# Altium footprint library Minh_Lib.PcbLib: 141 footprints (part 2 of 9)
Each footprint in its own frame and in the unit in brackets; x right, y up, seen from the top. Pads: shape width x height; smd on the part's side, far side on the other; paste and mask are expansions set on the pad; w line width, h text height; cw(c..) or ccw(c..) is an arc to the next point about the centre after c.
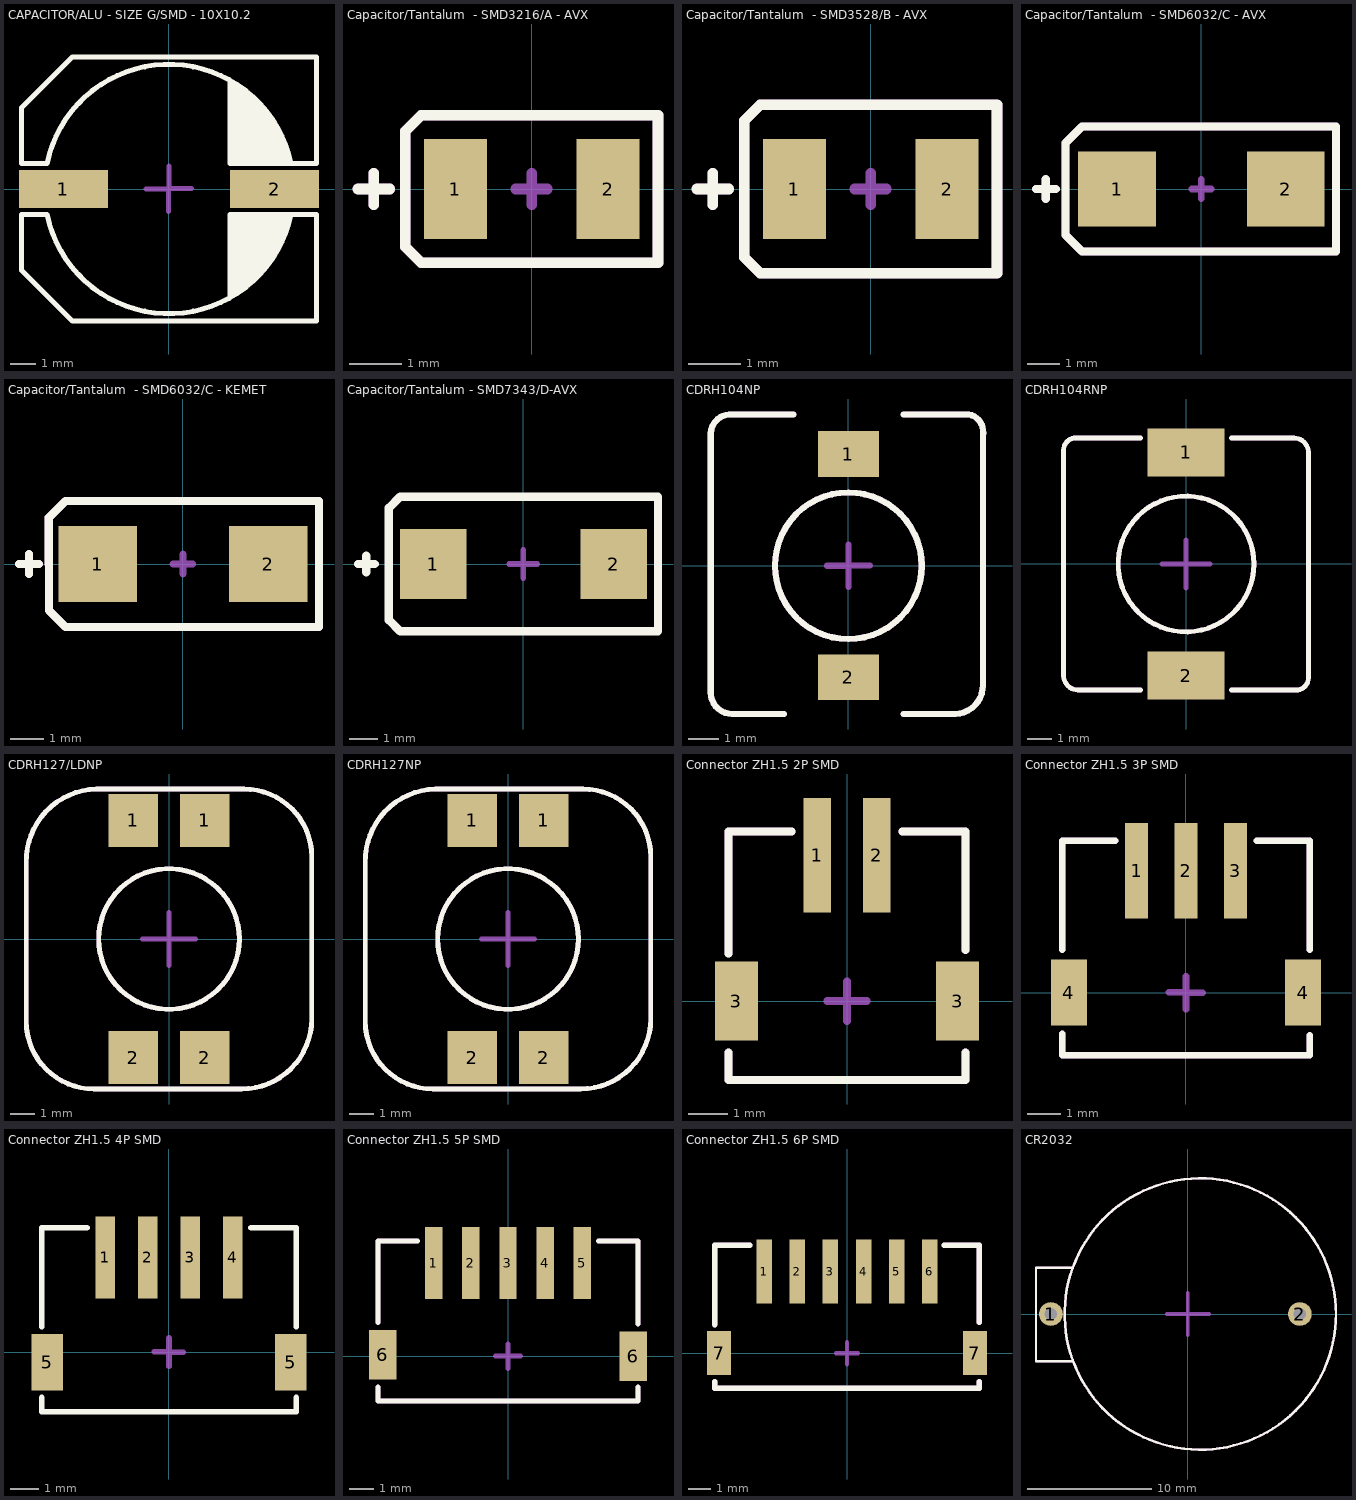
[diagram p1: the footprints below, top view; thin cyan lines are the x and y axes]

## CAPACITOR/ALU - SIZE G/SMD - 10X10.2 [mm] "CAPACITOR  -  ALUMINIUM - SIZE G / EEEFK - SMD"
pads (2):
  rect 3.5x1.5 smd: 1(-4.15,0) 2(4.15,0)
Top Overlay:
  region: 2.4,4.2 2.4,1 4.8,1 4.7,1.1 4.7,1.5 4.5,1.7 4.5,2.1 4.2,2.5 4.1,2.8 3.4,3.5 3.4,3.6
  region: 2.4,-4.2 2.4,-1 4.8,-1 4.8,-1.2 4.6,-1.4 4.6,-1.8 4.4,-2 4.4,-2.3 3.9,-2.8 3.9,-3 3,-3.9 2.9,-3.9
  lines w0.2: 2.4,-4.2 2.4,-1 4.8,-1 ; 2.4,4.2 2.4,1 4.8,1 ; 4.8,-1 cw(c0,0) -4.8,-1 -5.8,-1 -5.8,-3.2 -3.8,-5.2 5.8,-5.2 5.8,-1 4.8,-1 ; 4.8,1 ccw(c0,0) -4.8,1 -5.8,1 -5.8,3.2 -3.8,5.2 5.8,5.2 5.8,1 4.8,1
Mechanical 13:
  text "'.Designator'" at -5.701,-0.502 h1.5
Mechanical 15:
  lines w0.2: -0.909,0.007 -0.009,0.007 ; -0.013,-0.889 -0.013,0.011 ; -0.013,0.015 0.887,0.015 ; 0,0 0,0.9
3D body "User Library-capacitor size G.step": height 10.21, standoff -0.01, extent -5.8,-5.15 5.8,5.15

## Capacitor/Tantalum  - SMD3216/A - AVX [mm] "1206/3216-18 SIZE A-AVX"
pads (2):
  rect 1.2x1.9 smd: 1(-1.45,0) 2(1.45,0)
Top Overlay:
  lines w0.2: -3.3,0 -3,0 ; -3,-0.3 -3,0 ; -3,0.3 -3,0 ; -2.7,0 -3,0 ; -2.4,-1.1 -2.4,0.9 -2.4,1.1 -2.1,1.4 2.4,1.4 2.4,-1.4 -1.04,-1.4 -2.1,-1.4 -2.4,-1.1
Mechanical 13:
  lines w0.2: -3.3,0 -3,0 ; -3,-0.3 -3,0 ; -3,0.3 -3,0 ; -2.7,0 -3,0 ; -2.4,-1.1 -2.4,0.9 -2.4,1.1 -2.1,1.4 2.4,1.4 2.4,-1.4 -1.04,-1.4 -2.1,-1.4 -2.4,-1.1
  text "'.Designator'" at -1.96,-0.927 h1
Mechanical 15:
  lines w0.2: -0.3,0 0,0 ; 0,-0.3 0,0 ; 0,0.3 0,0 ; 0.3,0 0,0
3D body "User Library-AVX_ACASE.STEP": height 1.71, standoff 0, extent -1.7,-0.84 1.7,0.84

## Capacitor/Tantalum  - SMD3528/B - AVX [mm] "1210/3528-15 SIZE B-AVX"
pads (2):
  rect 1.2x1.9 smd: 1(-1.45,0) 2(1.45,0)
Top Overlay:
  lines w0.2: -3.3,0 -3,0 ; -3,-0.3 -3,0 ; -3,0.3 -3,0 ; -2.7,0 -3,0 ; -2.4,-1.3 -2.4,-1.1 -2.4,0.9 -2.4,1.1 -2.4,1.3 -2.1,1.6 2.4,1.6 2.4,-1.6 -0.84,-1.6 -2.1,-1.6 -2.4,-1.3
Mechanical 13:
  lines w0.2: -3.3,0 -3,0 ; -3,-0.3 -3,0 ; -3,0.3 -3,0 ; -2.7,0 -3,0 ; -2.4,-1.3 -2.4,-1.1 -2.4,0.9 -2.4,1.1 -2.4,1.3 -2.1,1.6 2.4,1.6 2.4,-1.6 -0.84,-1.6 -2.1,-1.6 -2.4,-1.3
  text "'.Designator'" at -2.01,-0.927 h1
Mechanical 15:
  lines w0.2: -0.3,0 0,0 ; 0,-0.3 0,0 ; 0,0.3 0,0 ; 0.3,0 0,0
3D body "User Library-AVX_BCASE.step": height 2.03, standoff 0, extent -1.85,-1.465 1.85,1.465

## Capacitor/Tantalum  - SMD6032/C - AVX [mm] "C-6032 / AVX"
pads (2):
  rect 2.37x2.3 smd: 1(-2.57,0) 2(2.57,0)
Top Overlay:
  lines w0.25: -5.04,0 -4.74,0 ; -4.74,-0.3 -4.74,0 ; -4.74,0.3 -4.74,0 ; -4.44,0 -4.74,0 ; -4.14,0 -4.14,1.3 -4.14,1.4 -3.64,1.9 -3.34,1.9 4.1,1.9 4.1,-1.9 -3.34,-1.9 -3.64,-1.9 -4.139,-1.401 -4.139,-1.284 -4.139,0.016
Mechanical 13:
  lines w0.25: -5.04,0 -4.74,0 ; -4.74,-0.3 -4.74,0 ; -4.74,0.3 -4.74,0 ; -4.44,0 -4.74,0 ; -4.14,0 -4.14,1.3 -4.14,1.4 -3.64,1.9 -3.34,1.9 4.1,1.9 4.1,-1.9 -3.34,-1.9 -3.64,-1.9 -4.139,-1.401 -4.139,-1.284 -4.139,0.016
  text "'.Designator'" at -3.501,-1.428 h1
Mechanical 15:
  lines w0.2: -0.3,0 0,0 ; 0,-0.3 0,0 ; 0,0.3 0,0 ; 0.3,0 0,0
3D body "User Library-AVX_C_CASE.step": height 2.7, standoff 0, extent -3.05,-1.675 3.05,1.675

## Capacitor/Tantalum  - SMD6032/C - KEMET [mm] "C-6032 / KEMET"
pads (2):
  rect 2.37x2.3 smd: 1(-2.57,0) 2(2.57,0)
Top Overlay:
  lines w0.25: -4.94,0 -4.64,0 ; -4.64,-0.3 -4.64,0 ; -4.64,0.3 -4.64,0 ; -4.34,0 -4.64,0 ; -4.04,0 -4.04,1.3 -4.04,1.4 -3.54,1.9 -3.24,1.9 4.1,1.9 4.1,-1.9 -3.24,-1.9 -3.54,-1.9 -4.039,-1.401 -4.039,0.016
Mechanical 13:
  lines w0.25: -4.94,0 -4.64,0 ; -4.64,-0.3 -4.64,0 ; -4.64,0.3 -4.64,0 ; -4.34,0 -4.64,0 ; -4.04,0 -4.04,1.3 -4.04,1.4 -3.54,1.9 -3.24,1.9 4.1,1.9 4.1,-1.9 -3.24,-1.9 -3.54,-1.9 -4.039,-1.401 -4.039,-1.284 -4.039,0.016
  text "'.Designator'" at -3.401,-1.428 h1
Mechanical 15:
  lines w0.2: -0.3,0 0,0 ; 0,-0.3 0,0 ; 0,0.3 0,0 ; 0.3,0 0,0
3D body "t494c107k006at.stp": height 2.81, standoff 0.01, extent -3.15,-1.75 3.15,1.75

## Capacitor/Tantalum - SMD7343/D-AVX [mm] "D-7343/AVX"
pads (2):
  rect 2.37x2.5 smd: 1(-3.22,0) 2(3.22,0)
Top Overlay:
  lines w0.3: -5.9,0 -5.6,0 ; -5.6,-0.3 -5.6,0 ; -5.6,0.3 -5.6,0 ; -5.3,0 -5.6,0 ; -4.8,-2 -4.8,-1.6 -4.8,1.5 -4.8,2 -4.4,2.4 4.8,2.4 4.8,-2.4 -4.4,-2.4 -4.8,-2
Mechanical 13:
  text "'.Designator'" at -4.36,-1.827 h1.3
Mechanical 15:
  lines w0.2: -0.5,0 0,0 ; 0,-0.5 0,0 ; 0,0.5 0,0 ; 0.5,0 0,0
3D body "User Library-AVX_D_CASE.step": height 3.01, standoff 0, extent -3.75,-2.225 3.65,2.225

## CDRH104NP [mm] "Inductor"
pads (2):
  rect 2x1.5 smd: 1(0,3.65) 2(0,-3.65)
Top Overlay:
  circle w0.2: c0,0 r2.4
  lines w0.2: -2.1,-4.85 -3.8,-4.85 cw(c-3.8,-4.15) -4.5,-4.15 -4.5,-2.65 -4.5,4.25 cw(c-3.85,4.3) -3.9,4.95 -1.8,4.95 ; 1.8,-4.85 3.5,-4.85 ccw(c3.475,-3.925) 4.4,-3.9 4.4,-2.15 4.4,4.25 ccw(c3.825,4.375) 3.95,4.95 1.8,4.95
Mechanical 13:
  circle w0.2: c0,0 r2.4
  lines w0.2: -2.1,-4.85 -3.8,-4.85 cw(c-3.8,-4.15) -4.5,-4.15 -4.5,-2.65 -4.5,4.25 cw(c-3.85,4.3) -3.9,4.95 -1.8,4.95 ; 1.8,-4.85 3.5,-4.85 ccw(c3.475,-3.925) 4.4,-3.9 4.4,-2.15 4.4,4.25 ccw(c3.825,4.375) 3.95,4.95 1.8,4.95
  text "'.Designator'" at -3.65,-3.667 h1
Mechanical 15:
  lines w0.2: -0.7,0 0,0 0,0.7 ; 0,-0.693 0,0.007 0.7,0.007
3D body "User Library-CDRH104.STEP": height 5, standoff 0, extent -4.45,-4.9 4.45,4.9

## CDRH104RNP [mm] "Inductor"
pads (2):
  rect 3.2x2 smd: 1(0,4.65) 2(0,-4.65)
Top Overlay:
  circle w0.2: c0,0 r2.828
  lines w0.2: -1.9,-5.25 -4.5,-5.25 cw(c-4.5,-4.65) -5.1,-4.65 -5.1,4.75 cw(c-4.6,4.75) -4.6,5.25 -1.9,5.25 ; 1.9,-5.25 4.6,-5.25 ccw(c4.6,-4.75) 5.1,-4.75 5.1,4.65 ccw(c4.5,4.65) 4.5,5.25 1.9,5.25
Mechanical 13:
  circle w0.2: c0,0 r2.828
  lines w0.2: -1.9,-5.25 -4.5,-5.25 cw(c-4.5,-4.65) -5.1,-4.65 -5.1,4.75 cw(c-4.6,4.75) -4.6,5.25 -1.9,5.25 ; 1.9,-5.25 4.6,-5.25 ccw(c4.6,-4.75) 5.1,-4.75 5.1,4.65 ccw(c4.5,4.65) 4.5,5.25 1.9,5.25
  text "'.Designator'" at -3.85,-3.517 h1
Mechanical 15:
  lines w0.2: -1,0 0,0 ; 0,-1 0,0 ; 0,1 0,0 ; 1,0 0,0
3D body "User Library-cdrh104r.STEP": height 4.05, standoff 0.05, extent -5.15,-5.25 5.15,5.25

## CDRH127/LDNP [mm] "Inductor"
pads (4):
  rect 2.05x2.2 smd: 1(-1.475,4.9) 1(1.475,4.9) 2(-1.475,-4.9) 2(1.475,-4.9)
Top Overlay:
  circle w0.2: c0,0 r2.907
  lines w0.2: -5.9,3.15 cw(c-2.925,3.225) -3,6.2 3.1,6.2 cw(c3.1,3.4) 5.9,3.4 5.9,3 5.9,0 5.9,-3 5.9,-3.3 cw(c3,-3.3) 3,-6.2 -3.1,-6.2 cw(c-3.1,-3.4) -5.9,-3.4 -5.9,-3 -5.9,0 -5.9,3 -5.9,3.3
Mechanical 13:
  circle w0.2: c0,0 r2.907
  lines w0.2: -5.9,3.15 cw(c-2.925,3.225) -3,6.2 3.1,6.2 cw(c3.1,3.4) 5.9,3.4 5.9,3 5.9,0 5.9,-3 5.9,-3.3 cw(c3,-3.3) 3,-6.2 -3.1,-6.2 cw(c-3.1,-3.4) -5.9,-3.4 -5.9,-3 -5.9,0 -5.9,3 -5.9,3.3
  text "'.Designator'" at -4.65,-4.417 h1
Mechanical 15:
  lines w0.2: -1.1,0 0,0 ; 0,-1.1 0,0 ; 0,1.1 0,0 ; 1.1,0 0,0
3D body "SUMIDA-CDRH127.step": height 7.45, standoff 0, extent -6,-6.171 6,6.171

## CDRH127NP [mm] "Inductor"
pads (4):
  rect 2.05x2.2 smd: 1(-1.475,4.9) 1(1.475,4.9) 2(-1.475,-4.9) 2(1.475,-4.9)
Top Overlay:
  circle w0.2: c0,0 r2.907
  lines w0.2: -5.9,3.15 cw(c-2.925,3.225) -3,6.2 3.1,6.2 cw(c3.1,3.4) 5.9,3.4 5.9,3 5.9,0 5.9,-3 5.9,-3.3 cw(c3,-3.3) 3,-6.2 -3.1,-6.2 cw(c-3.1,-3.4) -5.9,-3.4 -5.9,-3 -5.9,0 -5.9,3 -5.9,3.3
Mechanical 13:
  circle w0.2: c0,0 r2.907
  lines w0.2: -5.9,3.15 cw(c-2.925,3.225) -3,6.2 3.1,6.2 cw(c3.1,3.4) 5.9,3.4 5.9,3 5.9,0 5.9,-3 5.9,-3.3 cw(c3,-3.3) 3,-6.2 -3.1,-6.2 cw(c-3.1,-3.4) -5.9,-3.4 -5.9,-3 -5.9,0 -5.9,3 -5.9,3.3
  text "'.Designator'" at -4.65,-4.417 h1
Mechanical 15:
  lines w0.2: -1.1,0 0,0 ; 0,-1.1 0,0 ; 0,1.1 0,0 ; 1.1,0 0,0
3D body "SUMIDA-CDRH127.step": height 7.45, standoff 0, extent -6,-6.171 6,6.171

## Connector ZH1.5 2P SMD [mm]
pads (4):
  rect 0.7x2.9 smd: 1(-0.75,3.7) 2(0.75,3.7)
  rect 1.1x2 smd: 3(-2.8,0) 3(2.8,0)
Top Overlay:
  lines w0.2: -3,-1.3 -3,-2 3,-2 3,-1.3 ; -3,1.2 -3,4.3 -1.4,4.3 ; 1.4,4.3 3,4.3 3,1.3
Mechanical 13:
  lines w0.2: -3,-1.3 -3,-2 3,-2 3,-1.3 ; -3,1.2 -3,4.3 -1.4,4.3 ; 1.4,4.3 3,4.3 3,1.3
  text "'.Designator'" at -2.75,-1.417 h1
Mechanical 15:
  lines w0.2: -0.5,0 0,0 ; 0,-0.5 0,0 ; 0,0.5 0,0 ; 0.5,0 0,0
3D body "ZH1_5 2P.STEP": height 3.8, standoff 0, extent -3,-2 3,4.5

## Connector ZH1.5 3P SMD [mm]
pads (5):
  rect 0.7x2.9 smd: 1(-1.5,3.7) 2(0,3.7) 3(1.5,3.7)
  rect 1.1x2 smd: 4(-3.55,0) 4(3.55,0)
Top Overlay:
  lines w0.2: -3.75,-1.25 -3.75,-1.9 3.75,-1.9 3.75,-1.3 ; -3.75,1.3 -3.75,4.6 -2.15,4.6 ; 2.15,4.6 3.75,4.6 3.75,1.3
Mechanical 13:
  lines w0.2: -3.75,-1.25 -3.75,-1.9 3.75,-1.9 3.75,-1.3 ; -3.75,1.3 -3.75,4.6 -2.15,4.6 ; 2.15,4.6 3.75,4.6 3.75,1.3
  text "'.Designator'" at -3.65,-1.467 h1
Mechanical 15:
  lines w0.2: -0.518,0.015 -0.018,0.015 ; 0,-0.5 0,0 ; 0,0.5 0,0 ; 0.5,0 0,0
3D body "ZH1_5 3P.STEP": height 3.8, standoff 0, extent -3.75,-1.9 3.75,4.6

## Connector ZH1.5 4P SMD [mm]
pads (6):
  rect 0.7x2.9 smd: 1(-2.25,3.35) 2(-0.75,3.35) 3(0.75,3.35) 4(2.25,3.35)
  rect 1.1x2 smd: 5(-4.3,-0.35) 5(4.3,-0.35)
Top Overlay:
  lines w0.2: -4.5,-1.6 -4.5,-2.1 4.5,-2.1 4.5,-1.6 ; -4.5,0.9 -4.5,4.4 -2.9,4.4 ; 2.9,4.4 4.5,4.4 4.5,0.9
Mechanical 13:
  text "'.Designator'" at -4.35,-1.517 h1
Mechanical 15:
  lines w0.2: -0.518,0.015 -0.018,0.015 ; 0,-0.5 0,0 ; 0,0.5 0,0 ; 0.5,0 0,0
3D body "ZH1_5 4P.STEP": height 3.8, standoff 0, extent -4.5,-2.1 4.5,4.4

## Connector ZH1.5 5P SMD [mm]
pads (7):
  rect 0.7x2.9 smd: 1(-3,3.75) 2(-1.5,3.75) 3(0,3.75) 4(1.5,3.75) 5(3,3.75)
  rect 1.1x2 smd: 6(-5.05,0.05) 6(5.05,0)
Top Overlay:
  lines w0.2: -5.25,-1.25 -5.25,-1.8 5.25,-1.8 5.25,-1.25 ; -5.25,1.35 -5.25,4.65 -3.65,4.65 ; 3.65,4.65 5.25,4.65 5.25,1.3
Mechanical 13:
  lines w0.2: -5.25,-1.25 -5.25,-1.8 5.25,-1.8 5.25,-1.25 ; -5.25,1.35 -5.25,4.65 -3.65,4.65 ; 3.65,4.65 5.25,4.65 5.25,1.3
  text "'.Designator'" at -5.1,-1.317 h1
Mechanical 15:
  lines w0.2: -0.5,0 0,0 ; 0,-0.5 0,0 ; 0,0.5 0,0 ; 0.5,0 0,0
3D body "ZH1_5 5P.STEP": height 3.8, standoff 0, extent -5.25,-1.8 5.25,4.7

## Connector ZH1.5 6P SMD [mm]
pads (8):
  rect 0.7x2.9 smd: 1(-3.75,3.7) 2(-2.25,3.7) 3(-0.75,3.7) 4(0.75,3.7) 5(2.25,3.7) 6(3.75,3.7)
  rect 1.1x2 smd: 7(-5.8,0) 7(5.8,0)
Top Overlay:
  lines w0.254: -6,-1.3 -6,-1.6 6,-1.6 6,-1.3 ; -6,1.3 -6,4.9 -4.4,4.9 ; 4.4,4.9 6,4.9 6,1.4
Mechanical 13:
  lines w0.254: -6,-1.3 -6,-1.6 6,-1.6 6,-1.3 ; -6,1.3 -6,4.9 -4.4,4.9 ; 4.4,4.9 6,4.9 6,1.4
  text "'.Designator'" at -5.85,-1.117 h1
Mechanical 15:
  lines w0.2: -0.5,0 0,0 ; 0,-0.5 0,0 ; 0,0.5 0,0 ; 0.5,0 0,0
3D body "ZH1_5 6P.STEP": height 3.8, standoff 0, extent -6,-1.6 6,4.9

## CR2032 [mm]
pads (2):
  round 1.9 hole 1: 1(-11,0) 2(9,0)
Top Overlay:
  circle w0.2: c1,0 r10.9
  lines w0.2: -9.3,-3.8 -12.2,-3.8 -12.2,3.7 -9.3,3.7
Mechanical 13:
  circle w0.2: c1,0 r10.9
  lines w0.2: -9.3,-3.8 -12.2,-3.8 -12.2,3.7 -9.3,3.7
  text "'.Designator'" at -7.6,-5.834 h2
Mechanical 15:
  lines w0.3: -1.7,0 0,0 ; 0,-1.7 0,0 ; 0,1.7 0,0 ; 1.7,0 0,0
3D body "KLS5-CR2032-01 battery holder.stp": height 9.7, standoff -2.8, extent -12.25,-11.05 12.05,11.05